# Altium footprint library Connectors.PcbLib: 164 footprints (part 6 of 11)
Each footprint in its own frame and in the unit in brackets; x right, y up, seen from the top. Pads: shape width x height; smd on the part's side, far side on the other; paste and mask are expansions set on the pad; w line width, h text height; cw(c..) or ccw(c..) is an arc to the next point about the centre after c.
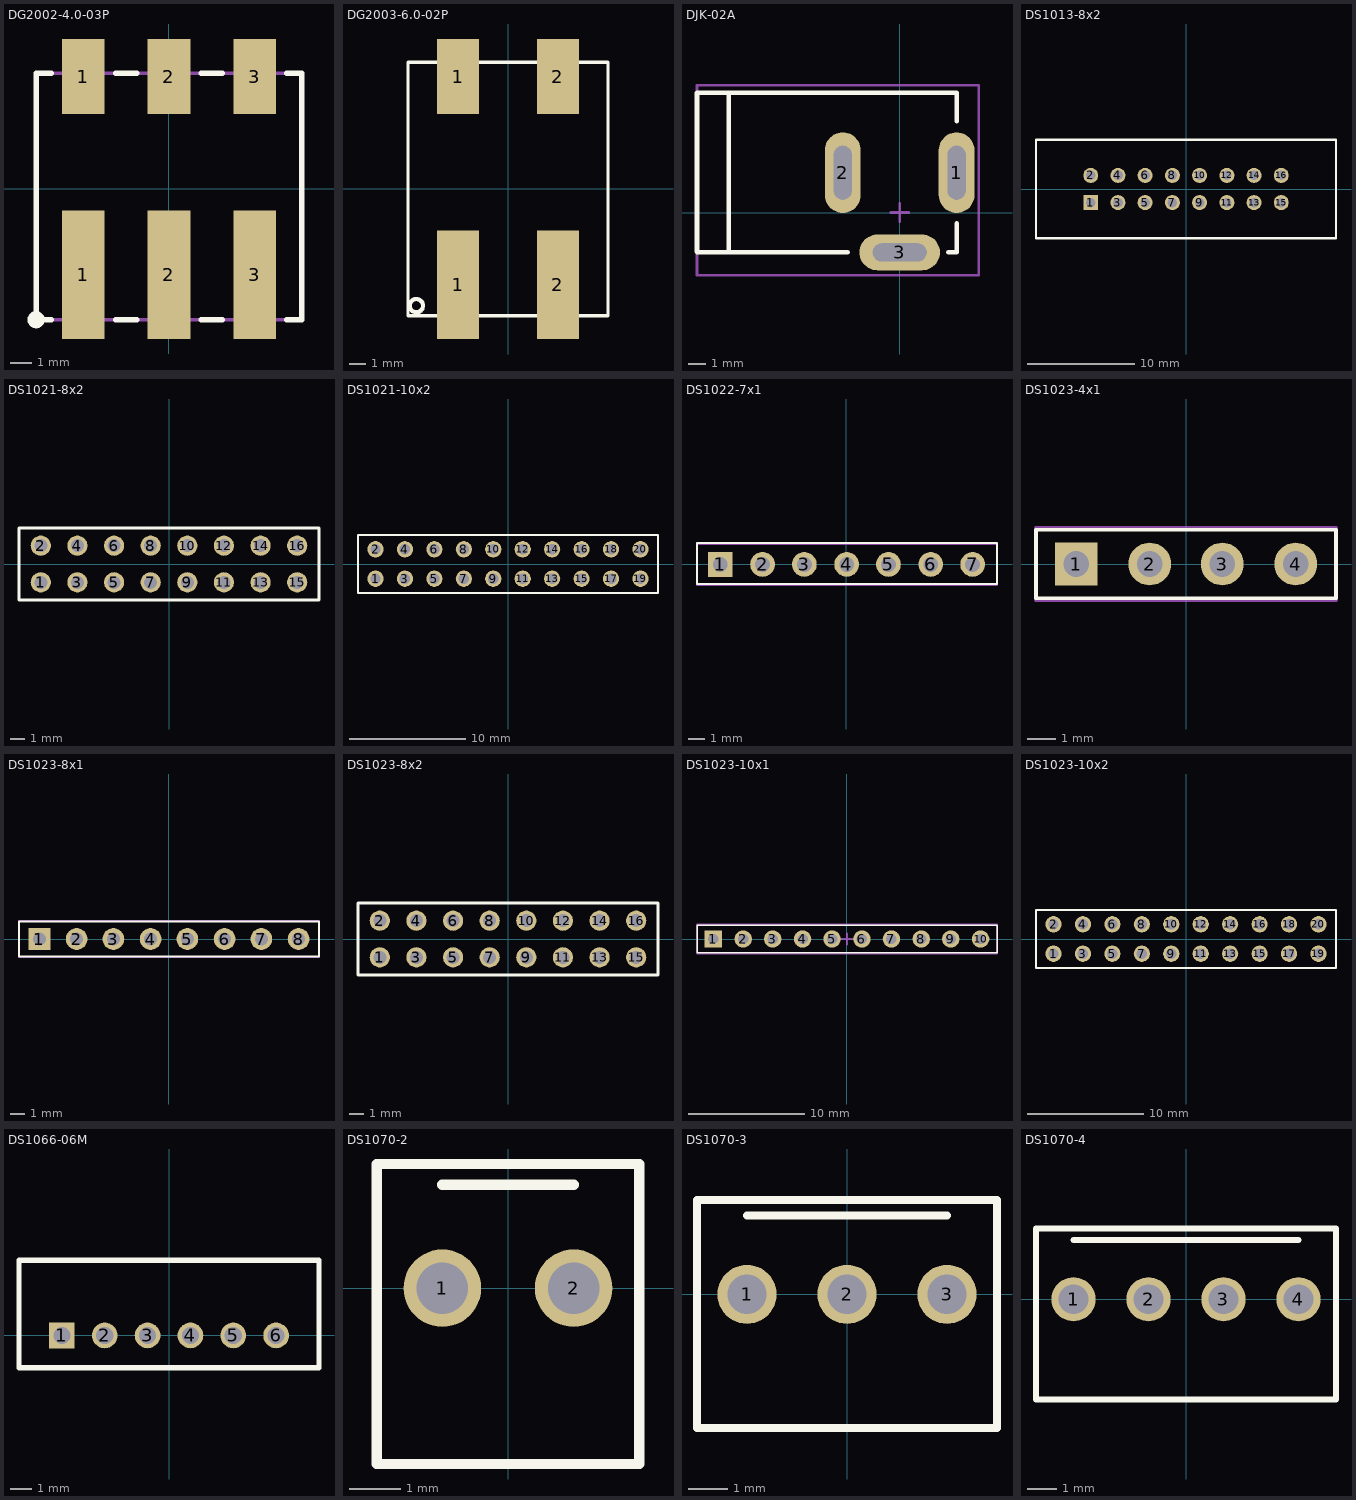
[diagram p5: the footprints below, top view; thin cyan lines are the x and y axes]

## DG2002-4.0-03P [mm]
height 4
pads (6):
  rect 2x6 smd: 1(-4,-4) 2(0,-4) 3(4,-4)
  rect 2x3.5 smd: 1(-4,5.25) 2(0,5.25) 3(4,5.25)
Top Overlay:
  circle w0.3: c-6.2,-6.1 r0.25
  lines w0.25: -5.5,-6.1 -6.2,-6.1 -6.2,5.4 -5.5,5.4 ; -2.5,-6.1 -1.5,-6.1 ; -2.5,5.4 -1.5,5.4 ; 1.5,-6.1 2.5,-6.1 ; 1.5,5.4 2.5,5.4 ; 5.5,-6.1 6.2,-6.1 6.2,5.4 5.5,5.4
Mechanical 15:
  lines w0.15: -6.15,-6.1 6.15,-6.1 6.15,5.4 -6.15,5.4 -6.15,-6.1
3D body "DG2002-4.0-03P-11-100A.STEP": height 4.05, standoff 0, extent -6.15,-6.261 6.15,6.839

## DG2003-6.0-02P [mm]
height 5.5
pads (4):
  rect 2.5x6.5 smd: 1(-3,-5.75) 2(3,-5.75)
  rect 2.5x4.5 smd: 1(-3,6.75) 2(3,6.75)
Top Overlay:
  circle w0.254: c-5.5,-7 r0.4
  lines w0.2: -6,-7.6 6,-7.6 6,7.6 -6,7.6 -6,-7.6

## DJK-02A [mm]
pads (3):
  oval 2x4.5 hole 1 slot 3 at 90 deg: 1(3.175,2.222) 2(-3.175,2.222)
  oval 4.5x2 hole 1 slot 3 at 0 deg: 3(0,-2.222)
Top Overlay:
  lines w0.25: -11.303,-2.2 -2.9,-2.2 ; 2.7,-2.2 3.175,-2.2 3.175,-0.6 ; 3.175,5.1 3.175,6.693
  lines w0.254: -11.303,-2.197 -11.303,6.693 3.175,6.693 ; -9.525,-2.095 -9.525,6.54
Mechanical 15:
  lines w0.15: -0.5,0 0.5,0 ; 0,-0.5 0,0.5 ; -11.3,-3.5 4.4,-3.5 4.4,7.1 -11.3,7.1 -11.3,-3.5
3D body "User Library-DC_Power.STEP": height 11, standoff -3.5, extent -10.832,-2.4 3.568,6.9

## DS1013-8x2 [mm]
height 9
pads (16):
  rect 1.4x1.4 hole 0.9: 1(-8.89,-1.27)
  round 1.4 hole 0.9: 2(-8.89,1.27) 3(-6.35,-1.27) 4(-6.35,1.27) 5(-3.81,-1.27) 6(-3.81,1.27) 7(-1.27,-1.27) 8(-1.27,1.27) 9(1.27,-1.27) 10(1.27,1.27) 11(3.81,-1.27) 12(3.81,1.27) 13(6.35,-1.27) 14(6.35,1.27) 15(8.89,-1.27) 16(8.89,1.27)
Top Overlay:
  lines w0.2: -14,-4.6 -14,4.6 14,4.6 14,-4.6 -14,-4.6
3D body "User Library-DS1013-16S (IDC-16MS CONNFLY).step": height 9, standoff -3.6, extent -14.07,-4.43 14.05,4.47

## DS1021-8x2 [mm]
height 8.5
pads (16):
  round 1.4 hole 0.9: 1(-8.89,-1.27) 2(-8.89,1.27) 3(-6.35,-1.27) 4(-6.35,1.27) 5(-3.81,-1.27) 6(-3.81,1.27) 7(-1.27,-1.27) 8(-1.27,1.27) 9(1.27,-1.27) 10(1.27,1.27) 11(3.81,-1.27) 12(3.81,1.27) 13(6.35,-1.27) 14(6.35,1.27) 15(8.89,-1.27) 16(8.89,1.27)
Top Overlay:
  lines w0.2: -10.4,-2.5 -10.4,2.5 10.4,2.5 10.4,-2.5 -10.4,-2.5
3D body "Header 2x8 Male.stp": height 8.6, standoff -3.2, extent -10.16,-2.5 10.16,2.5

## DS1021-10x2 [mm]
height 8.5
pads (20):
  round 1.4 hole 0.9: 1(-11.43,-1.27) 2(-11.43,1.27) 3(-8.89,-1.27) 4(-8.89,1.27) 5(-6.35,-1.27) 6(-6.35,1.27) 7(-3.81,-1.27) 8(-3.81,1.27) 9(-1.27,-1.27) 10(-1.27,1.27) 11(1.27,-1.27) 12(1.27,1.27) 13(3.81,-1.27) 14(3.81,1.27) 15(6.35,-1.27) 16(6.35,1.27) 17(8.89,-1.27) 18(8.89,1.27) 19(11.43,-1.27) 20(11.43,1.27)
Top Overlay:
  lines w0.2: -12.94,-2.5 -12.94,2.5 12.94,2.5 12.94,-2.5 -12.94,-2.5
3D body "User Library-Pin Header 2X10.STEP": height 7.98, standoff -3.02, extent -12.7,-2.5 12.7,2.58

## DS1022-7x1 [mm]
height 8.5
pads (7):
  rect 1.5x1.5 hole 0.9: 1(-7.665,0)
  round 1.5 hole 0.9: 2(-5.095,0) 3(-2.555,0) 4(0.015,0) 5(2.555,0) 6(5.125,0) 7(7.665,0)
Top Overlay:
  lines w0.127: -9.075,-1.2 9.145,-1.2 9.145,1.3 -9.075,1.3 -9.075,-1.2
Mechanical 15:
  lines w0.15: -9.075,-1.25 -9.075,1.25 9.145,1.25 9.145,-1.25 -9.075,-1.25
3D body "825437-7.stp": height 6.62, standoff -4.7, extent -8.875,-2.4 8.905,4.45

## DS1023-4x1 [mm]
height 8.5
pads (4):
  rect 1.5x1.5 hole 0.9: 1(-3.84,0)
  round 1.5 hole 0.9: 2(-1.27,0) 3(1.27,0) 4(3.84,0)
Top Overlay:
  lines w0.127: -5.25,-1.2 5.25,-1.2 5.25,1.2 -5.25,1.2 -5.25,-1.2
Mechanical 15:
  lines w0.15: -5.25,-1.25 5.25,-1.25 5.25,1.25 -5.25,1.25 -5.25,-1.25
3D body "User Library-PBS_(DS1023)_1line_connectors_h=5_0_8_5mm_step_2_54mm-1.step": height 8.6, standoff -2.9, extent -5.34,-1.25 5.32,1.25

## DS1023-8x1 [mm]
height 8.5
pads (8):
  rect 1.5x1.5 hole 0.9: 1(-8.95,0)
  round 1.5 hole 0.9: 2(-6.38,0) 3(-3.84,0) 4(-1.27,0) 5(1.27,0) 6(3.84,0) 7(6.38,0) 8(8.95,0)
Top Overlay:
  lines w0.127: -10.36,-1.2 10.36,-1.2 10.36,1.2 -10.36,1.2 -10.36,-1.2
Mechanical 15:
  lines w0.15: -10.36,-1.25 10.36,-1.25 10.36,1.25 -10.36,1.25 -10.36,-1.25
3D body "User Library-PBS_(DS1023)_1line_connectors_h=5_0_8_5mm_step_2_54mm-1.step": height 8.6, standoff -2.9, extent -0.23,-1.25 10.43,1.25
3D body "User Library-PBS_(DS1023)_1line_connectors_h=5_0_8_5mm_step_2_54mm-1.step": height 8.6, standoff -2.9, extent -10.45,-1.25 0.21,1.25

## DS1023-8x2 [mm]
height 8.5
pads (16):
  round 1.4 hole 0.9: 1(-8.89,-1.27) 2(-8.89,1.27) 3(-6.35,-1.27) 4(-6.35,1.27) 5(-3.81,-1.27) 6(-3.81,1.27) 7(-1.27,-1.27) 8(-1.27,1.27) 9(1.27,-1.27) 10(1.27,1.27) 11(3.81,-1.27) 12(3.81,1.27) 13(6.35,-1.27) 14(6.35,1.27) 15(8.89,-1.27) 16(8.89,1.27)
Top Overlay:
  lines w0.2: -10.4,-2.5 -10.4,2.5 10.4,2.5 10.4,-2.5 -10.4,-2.5
3D body "User Library-zl262-16d_p2-54_l20-82_w5_h8-5.step": height 8.5, standoff -3, extent -10.41,-2.5 10.41,2.5

## DS1023-10x1 [mm]
height 8.5
pads (10):
  rect 1.5x1.5 hole 0.9: 1(-11.505,0)
  round 1.5 hole 0.9: 2(-8.935,0) 3(-6.395,0) 4(-3.825,0) 5(-1.285,0) 6(1.285,0) 7(3.825,0) 8(6.395,0) 9(8.935,0) 10(11.505,0)
Top Overlay:
  lines w0.127: -12.915,-1.2 12.915,-1.2 12.915,1.2 -12.915,1.2 -12.915,-1.2
Mechanical 15:
  lines w0.15: -0.5,0 0.5,0 ; 0,-0.5 0,0.5 ; -12.915,-1.25 12.915,-1.25 12.915,1.25 -12.915,1.25 -12.915,-1.25
3D body "User Library-PBS_(DS1023)_1line_connectors_h=5_0_8_5mm_step_2_54mm-1.step": height 8.6, standoff -2.9, extent -2.785,-1.25 7.875,1.25
3D body "User Library-PBS_(DS1023)_1line_connectors_h=5_0_8_5mm_step_2_54mm-1.step": height 8.6, standoff -2.9, extent -13.005,-1.25 -2.345,1.25
3D body "User Library-PBS_(DS1023)_1line_connectors_h=5_0_8_5mm_step_2_54mm-1.step": height 8.6, standoff -2.9, extent 2.325,-1.25 12.985,1.25

## DS1023-10x2 [mm]
height 8.5
pads (20):
  round 1.4 hole 0.9: 1(-11.43,-1.27) 2(-11.43,1.27) 3(-8.89,-1.27) 4(-8.89,1.27) 5(-6.35,-1.27) 6(-6.35,1.27) 7(-3.81,-1.27) 8(-3.81,1.27) 9(-1.27,-1.27) 10(-1.27,1.27) 11(1.27,-1.27) 12(1.27,1.27) 13(3.81,-1.27) 14(3.81,1.27) 15(6.35,-1.27) 16(6.35,1.27) 17(8.89,-1.27) 18(8.89,1.27) 19(11.43,-1.27) 20(11.43,1.27)
Top Overlay:
  lines w0.2: -12.94,-2.5 12.94,-2.5 12.94,2.5 -12.94,2.5 -12.94,-2.5
3D body "User Library-Header 2x10 2_54mm_Female.step": height 8.5, standoff -2.6, extent -12.85,-2.54 12.85,2.46

## DS1066-06M [mm] "PCB Connector 2.0mm PH TYPE"
height 6
pads (6):
  rect 1.2x1.2 hole 0.8: 1(-5,0)
  round 1.2 hole 0.8: 2(-3,0) 3(-1,0) 4(1,0) 5(3,0) 6(5,0)
Top Overlay:
  lines w0.254: -7,-1.5 7,-1.5 7,3.5 -7,3.5 -7,-1.5
3D body "User Library-MW-6M-1.step": height 6.2, standoff -2.7, extent -7.05,-1.4 6.85,3.4

## DS1070-2 [mm]
height 11.5
pads (2):
  round 1.5 hole 1: 1(-1.27,0) 2(1.27,0)
Top Overlay:
  lines w0.2: -1.27,2 1.27,2 ; -2.54,-3.4 -2.54,2.4 2.54,2.4 2.54,-3.4 -2.54,-3.4
3D body "User Library-DS1070-2 (WF-2 CONNFLY).step": height 11.4, standoff -3.3, extent -2.54,-3.5 2.54,2.4

## DS1070-3 [mm]
height 11.5
pads (3):
  round 1.5 hole 1: 1(-2.54,0) 2(0,0) 3(2.54,0)
Top Overlay:
  lines w0.2: -2.54,2 2.54,2 ; -3.81,-3.4 -3.81,2.4 3.81,2.4 3.81,-3.4 -3.81,-3.4
3D body "User Library-DS1070-3 (WF-3 CONNFLY).step": height 11.4, standoff -3.3, extent -3.81,-3.5 3.81,2.4

## DS1070-4 [mm]
pads (4):
  round 1.5 hole 1: 1(-3.81,0) 2(-1.27,0) 3(1.27,0) 4(3.81,0)
Top Overlay:
  lines w0.2: -3.81,2 3.81,2 ; -5.08,-3.4 -5.08,2.4 5.08,2.4 5.08,-3.4 -5.08,-3.4
3D body "User Library-DS1070-4 (WF-4 CONNFLY).step": height 11.4, standoff -3.3, extent -5.08,-3.5 5.08,2.4